# Altium footprint library agh_racing_2018.PcbLib: 166 footprints (part 7 of 11)
Each footprint in its own frame and in the unit in brackets; x right, y up, seen from the top. Pads: shape width x height; smd on the part's side, far side on the other; paste and mask are expansions set on the pad; w line width, h text height; cw(c..) or ccw(c..) is an arc to the next point about the centre after c.
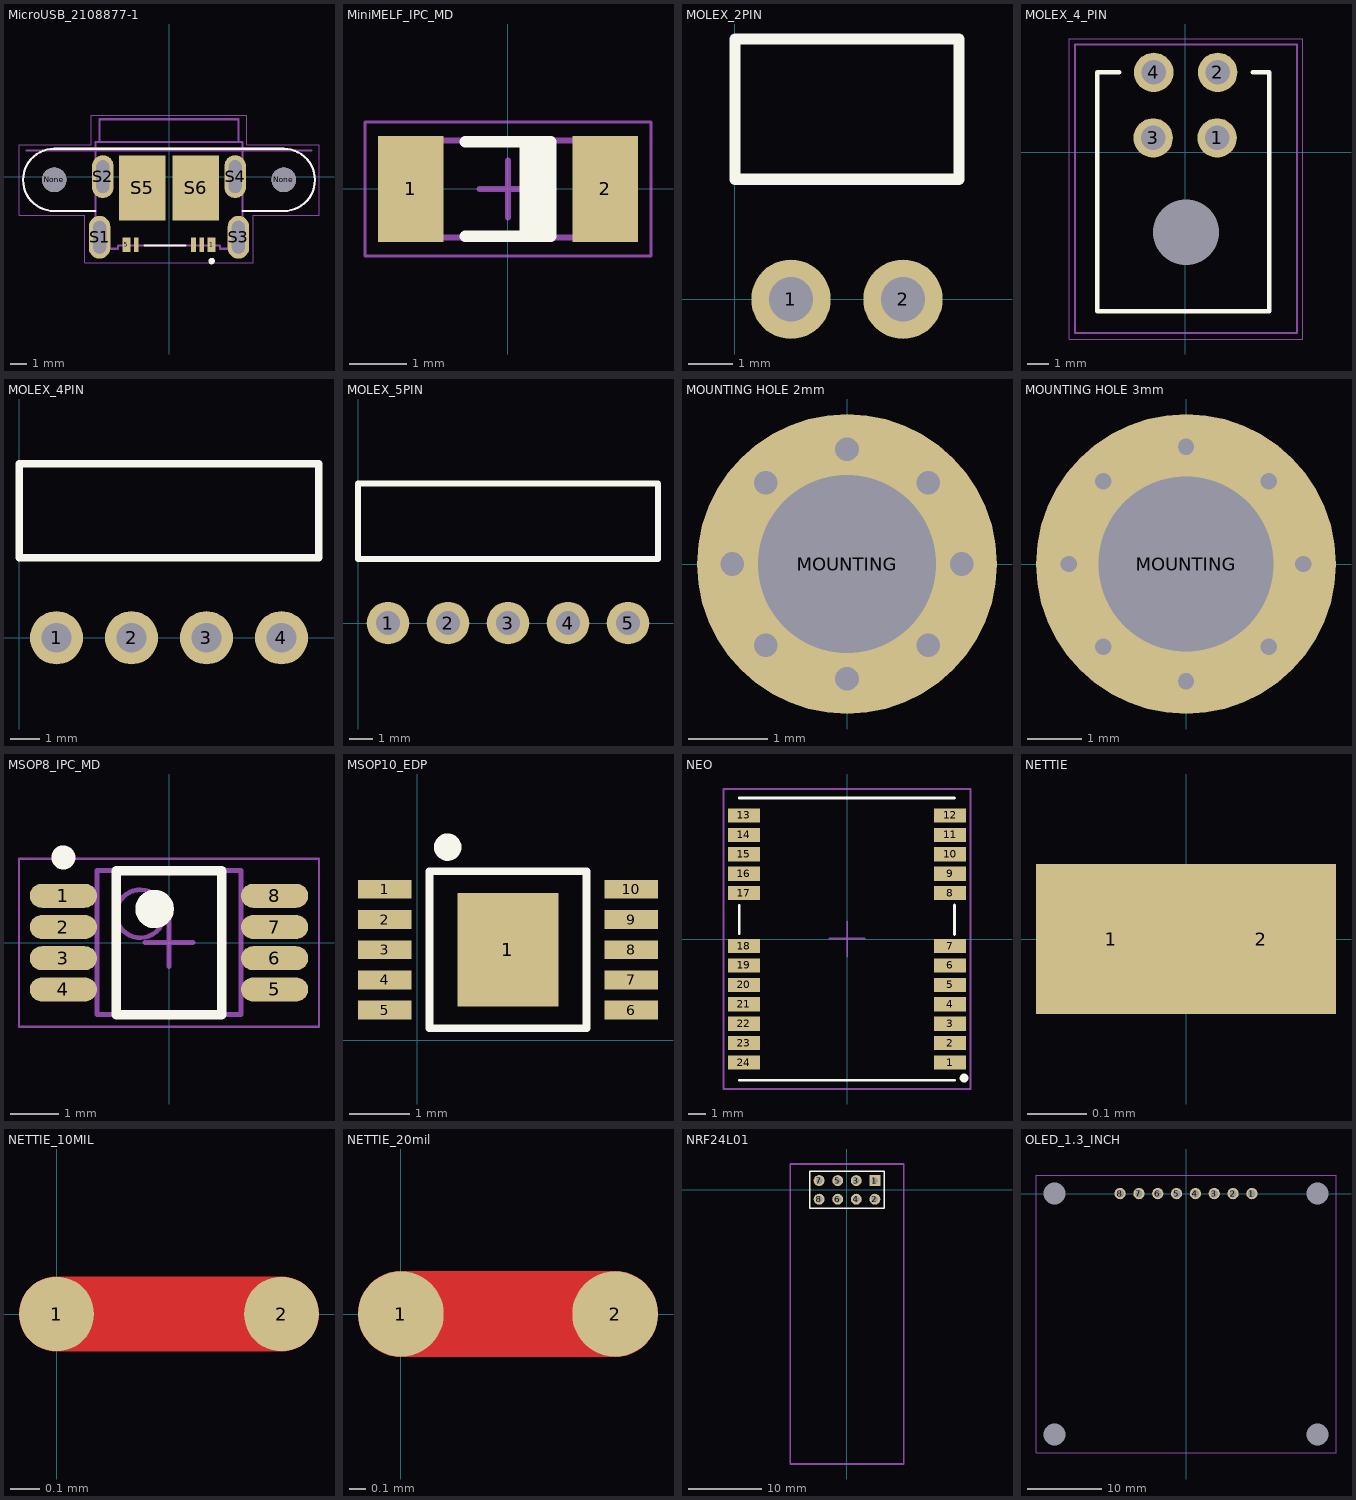
[diagram p6: the footprints below, top view; thin cyan lines are the x and y axes]

## MicroUSB_2108877-1 [mm]
pads (13):
  rect 0.5x0.9 smd: 1(2.6,-4.15) 5(-2.6,-4.15)
  rect 0.3x0.9 smd: 2(2,-4.15) 3(1.5,-4.15) 4(-2,-4.15)
  round 1.5 hole 1.5 unplated: None(-7,-0.2) None(7,-0.2)
  oval 1.308x2.616 hole 0.8 slot 2 at 90 deg: S1(-4.235,-3.7) S2(-4.035,0) S3(4.235,-3.7) S4(4.035,0)
  rect 2.85x3.98 smd: S5(-1.625,-0.69) S6(1.625,-0.69)
Top Overlay:
  circle w0.2: c2.6,-5.15 r0.1
  lines w0.127: -4.5,-2.1 -7,-2.1 cw(c-7,-0.2) -8.9,-0.2 cw(c-7,-0.2) -7,1.7 -4.485,1.7 4.485,1.7 7,1.7 cw(c7,-0.2) 8.9,-0.2 cw(c7,-0.2) 7,-2.1 4.5,-2.1 ; -1.5,-4.2 1,-4.2
Mechanical 1:
  lines w0: -4.635,-4.2 ccw(c-4.235,-4.2) -4.235,-4.6 ccw(c-4.235,-4.2) -3.835,-4.2 -3.835,-3.2 ccw(c-4.235,-3.2) -4.235,-2.8 ccw(c-4.235,-3.2) -4.635,-3.2 -4.635,-4.2 ; -4.435,-0.5 ccw(c-4.035,-0.5) -4.035,-0.9 ccw(c-4.035,-0.5) -3.635,-0.5 -3.635,0.5 ccw(c-4.035,0.5) -4.035,0.9 ccw(c-4.035,0.5) -4.435,0.5 -4.435,-0.5 ; 3.635,-0.5 ccw(c4.035,-0.5) 4.035,-0.9 ccw(c4.035,-0.5) 4.435,-0.5 4.435,0.5 ccw(c4.035,0.5) 4.035,0.9 ccw(c4.035,0.5) 3.635,0.5 3.635,-0.5 ; 3.835,-4.2 ccw(c4.235,-4.2) 4.235,-4.6 ccw(c4.235,-4.2) 4.635,-4.2 4.635,-3.2 ccw(c4.235,-3.2) 4.235,-2.8 ccw(c4.235,-3.2) 3.835,-3.2 3.835,-4.2
Courtyard Top:
  lines w0.127: -8.9,-0.2 cw(c-7,-0.2) -7,1.7 ; -8.9,-0.2 ccw(c-7,-0.2) -7,-2.1 ; -8.9,-0.2 cw(c-7,-0.2) -7,1.7 ; -8.9,-0.2 ccw(c-7,-0.2) -7,-2.1 ; -7,-2.1 -4.485,-2.1 ; -7,-2.1 -4.485,-2.1 ; -7,1.7 -4.485,1.7 ; -7,1.7 -4.485,1.7 ; -4.485,-4.4 -3.1,-4.4 ; -4.485,-4.4 -4.485,-2.1 ; -4.485,-4.4 -3.1,-4.4 ; -4.485,-4.4 -4.485,-2.1 ; -4.485,-2.1 -4.485,1.715 ; -4.485,-2.1 -4.485,1.715 ; -4.485,1.7 cw(c-4.477,1.707) -4.485,1.715 ; -4.485,1.7 cw(c-4.477,1.707) -4.485,1.715 ; -4.485,1.7 4.485,1.7 ; -4.485,1.7 4.485,1.7 ; -4.485,1.715 -4.485,2.1 ; -4.485,1.715 -4.485,2.1 ; -4.485,2.1 -4.235,2.1 ; -4.485,2.1 -4.235,2.1 ; -4.235,2.1 4.235,2.1 ; -4.235,2.1 -4.235,3.5 ; -4.235,2.1 4.235,2.1 ; -4.235,2.1 -4.235,3.5 ; -4.235,3.5 4.235,3.5 ; -4.235,3.5 4.235,3.5 ; -3.1,-4.4 -3.1,-4.2 ; -3.1,-4.4 -3.1,-4.2 ; -3.1,-4.2 3.1,-4.2 ; -3.1,-4.2 3.1,-4.2 ; 3.1,-4.4 3.1,-4.2 ; 3.1,-4.4 4.485,-4.4 ; 3.1,-4.4 3.1,-4.2 ; 3.1,-4.4 4.485,-4.4 ; 4.235,2.1 4.485,2.1 ; 4.235,2.1 4.235,3.5 ; 4.235,2.1 4.485,2.1 ; 4.235,2.1 4.235,3.5 ; 4.485,-4.4 4.485,-2.1 ; 4.485,-4.4 4.485,-2.1 ; 4.485,-2.1 4.485,1.715 ; 4.485,-2.1 7,-2.1 ; 4.485,-2.1 4.485,1.715 ; 4.485,-2.1 7,-2.1 ; 4.485,1.7 ccw(c4.477,1.707) 4.485,1.715 ; 4.485,1.7 ccw(c4.477,1.707) 4.485,1.715 ; 4.485,1.7 7,1.7 ; 4.485,1.7 7,1.7 ; 4.485,1.715 4.485,2.1 ; 4.485,1.715 4.485,2.1 ; 7,-2.1 ccw(c7,-0.2) 8.9,-0.2 ; 7,-2.1 ccw(c7,-0.2) 8.9,-0.2 ; 7,1.7 cw(c7,-0.2) 8.9,-0.2 ; 7,1.7 cw(c7,-0.2) 8.9,-0.2 ; -8.7,1.6 8.7,1.6 -8.7,1.6
Mechanical 16:
  lines w0.05: -9.15,-2.35 -9.15,1.95 -4.735,1.95 -4.735,3.75 4.735,3.75 4.735,1.95 9.15,1.95 9.15,-2.35 5.14,-2.35 5.14,-5.26 -5.14,-5.26 -5.14,-2.35 -9.15,-2.35
3D body "c-2108877-1-b-3d.stp": height 3.39, standoff -0.64, extent -8.9,-4.4 8.9,3.5

## MiniMELF_IPC_MD [mm] "MELF Diode, 2-Leads, Body 3.50x1.65mm, IPC Medium Density"
height 1.7
pads (2):
  rect 1.15x1.85 smd: 1(-1.7,0) 2(1.7,0)
Top Overlay:
  rectangle: 0.2,-0.825 0.75,0.825
  lines w0.2: -0.75,-0.825 0.75,-0.825 0.75,0.825 -0.75,0.825
Mechanical 13:
  lines w0.1: -1.85,-0.85 1.85,-0.85 1.85,0.85 -1.85,0.85 -1.85,-0.85
Mechanical 15:
  lines w0.05: -2.5,-1.175 2.5,-1.175 2.5,1.175 -2.5,1.175 -2.5,-1.175
  lines w0.1: -0.5,0 0.5,0 ; 0,-0.5 0,0.5
3D body "MiniMELF_IPC_MD2.step": height 1.65, standoff 0.01, extent -1.75,-0.823 1.75,0.823

## MOLEX_2PIN [mm] "MOLEX Connector, 2-pin"
pads (2):
  round 1.8 hole 1: 1(1.27,0) 2(3.81,0)
Top Overlay:
  lines w0.254: 0,2.72 0,5.9 5.08,5.9 5.08,2.72 0,2.72
3D body "022057028.stp": height 5.84, standoff -3.8, extent 0,-0.318 5.08,14.42

## MOLEX_4_PIN [mm]
height 7.75
pads (5):
  round 1.8 hole 1.12: 1(1.45,0.66) 2(1.475,3.66) 3(-1.475,0.66) 4(-1.45,3.66)
  round 0 hole 3: ""(0.025,-3.66)
Top Overlay:
  lines w0.2: -3.023,3.66 -4.039,3.66 -4.039,-7.262 3.835,-7.262 3.835,3.66 3.073,3.66
Mechanical 1:
  lines w0.1: -5.05,-8.26 5.1,-8.26 5.1,4.93 -5.05,4.93 -5.05,-8.26
Mechanical 15:
  lines w0.05: -5.309,-8.532 -5.309,5.184 5.359,5.184 5.359,-8.532 -5.309,-8.532
3D body "430450400.stp": height 8.77, standoff -3.17, extent -5.05,-8.26 5.1,3.98

## MOLEX_4PIN [mm] "MOLEX Connector, 4-pin"
pads (4):
  round 1.8 hole 1: 1(1.27,0) 2(3.81,0) 3(6.35,0) 4(8.89,0)
Top Overlay:
  lines w0.254: 0,2.72 10.16,2.72 10.16,5.9 0,5.9 0,2.72
3D body "022057048.stp": height 5.85, standoff -3.79, extent 0,-0.317 10.16,14.42

## MOLEX_5PIN [mm] "MOLEX Connector, 5-pin"
pads (5):
  round 1.8 hole 1: 1(1.27,0) 2(3.81,0) 3(6.35,0) 4(8.89,0) 5(11.43,0)
Top Overlay:
  lines w0.254: 0,2.72 12.7,2.72 12.7,5.9 0,5.9 0,2.72
3D body "022057058.stp": height 5.85, standoff -3.79, extent 0,-0.317 12.7,14.42

## MOUNTING HOLE 2mm [mm]
pads (1):
  round 3.8 hole 2.25 paste+0 mask+0: MOUNTING(0,0)
via -1.455,0 diameter 0.711 hole 0.3
via -1.029,-1.029 diameter 0.711 hole 0.3
via 0,-1.455 diameter 0.711 hole 0.3
via 1.029,-1.029 diameter 0.711 hole 0.3
via 1.455,0 diameter 0.711 hole 0.3
via 1.029,1.029 diameter 0.711 hole 0.3
via 0,1.455 diameter 0.711 hole 0.3
via -1.029,1.029 diameter 0.711 hole 0.3

## MOUNTING HOLE 3mm [mm]
pads (1):
  round 5.5 hole 3.2 paste+0 mask+0: MOUNTING(0,0)
via -2.15,0 diameter 0.711 hole 0.3
via -1.52,1.52 diameter 0.711 hole 0.3
via 1.52,1.52 diameter 0.711 hole 0.3
via 2.15,0 diameter 0.711 hole 0.3
via 1.52,-1.52 diameter 0.711 hole 0.3
via 0,-2.15 diameter 0.711 hole 0.3
via -1.52,-1.52 diameter 0.711 hole 0.3
via 0,2.15 diameter 0.711 hole 0.3

## MSOP8_IPC_MD [mm] "TSOP, 8-Leads, Body 3.00x3.00mm, Pitch 0.65mm, IPC Medium Density"
height 1.1
pads (8):
  oval 1.4x0.5 smd: 1(-2.2,0.975) 2(-2.2,0.325) 3(-2.2,-0.325) 4(-2.2,-0.975) 5(2.2,-0.975) 6(2.2,-0.325) 7(2.2,0.325) 8(2.2,0.975)
Top Overlay:
  circle w0.25: c-2.2,1.775 r0.125
  circle w0.4: c-0.3,0.7 r0.2
  lines w0.2: -1.1,-1.5 -1.1,1.5 1.1,1.5 1.1,-1.5 -1.1,-1.5
Mechanical 13:
  circle w0.1: c-0.6,0.6 r0.5
  lines w0.1: -1.5,-1.5 -1.5,1.5 1.5,1.5 1.5,-1.5 -1.5,-1.5
Mechanical 15:
  lines w0.05: -3.125,-1.75 -3.125,1.75 3.125,1.75 3.125,-1.75 -3.125,-1.75
  lines w0.1: -0.5,0 0.5,0 ; 0,-0.5 0,0.5
3D body "MSOP8_IPC_MD.step": height 1.1, standoff 0, extent -2.45,-1.5 2.45,1.5

## MSOP10_EDP [mm] "MSOP, 10-pin, Exposed Die Pad"
pads (11):
  rect 0.89x0.31 smd: 1(-0.54,2.5) 2(-0.54,2) 3(-0.54,1.5) 4(-0.54,1) 5(-0.54,0.5) 6(3.54,0.5) 7(3.54,1) 8(3.54,1.5) 9(3.54,2) 10(3.54,2.5)
  rect 1.68x1.88 smd: 1(1.5,1.5)
Top Overlay:
  circle w0.254: c0.5,3.2 r0.1
  lines w0.127: 0.2,0.2 2.8,0.2 2.8,2.8 0.2,2.8 0.2,0.2
3D body "msop-10.SLDPRT": height 1.16, standoff 0.01, extent -0.95,0 3.95,3

## NEO [mm] "u-blox NEO GNSS module"
pads (24):
  rect 1.8x0.8 smd paste-0.1: 1(5.842,-7) 2(5.842,-5.9) 3(5.842,-4.8) 4(5.842,-3.7) 5(5.842,-2.6) 6(5.842,-1.5) 7(5.842,-0.4) 8(5.842,2.6) 9(5.842,3.7) 10(5.842,4.8) 11(5.842,5.9) 12(5.842,7) 13(-5.842,7) 14(-5.842,5.9) 15(-5.842,4.8) 16(-5.842,3.7) 17(-5.842,2.6) 18(-5.842,-0.4) 19(-5.842,-1.5) 20(-5.842,-2.6) 21(-5.842,-3.7) 22(-5.842,-4.8) 23(-5.842,-5.9) 24(-5.842,-7)
Top Overlay:
  circle w0.38: c6.636,-7.879 r0.058
  lines w0.16: -6.109,-8 6.096,-8 ; -6.109,7.996 6.09,7.996 ; -6.102,0.299 -6.102,1.893 ; 6.096,0.255 6.096,1.919
Top Paste:
  rectangle: 5.642,-7.4 6.842,-6.6
  rectangle: 5.642,-6.3 6.842,-5.5
  rectangle: 5.642,-5.2 6.842,-4.4
  rectangle: 5.642,-4.1 6.842,-3.3
  rectangle: 5.642,-3 6.842,-2.2
  rectangle: 5.642,-1.9 6.842,-1.1
  rectangle: 5.642,-0.8 6.842,0
  rectangle: 5.642,2.2 6.842,3
  rectangle: 5.642,3.3 6.842,4.1
  rectangle: 5.642,4.4 6.842,5.2
  rectangle: 5.642,5.5 6.842,6.3
  rectangle: 5.642,6.6 6.842,7.4
  rectangle: -6.833,6.6 -5.633,7.4
  rectangle: -6.833,5.5 -5.633,6.3
  rectangle: -6.833,4.4 -5.633,5.2
  rectangle: -6.833,3.3 -5.633,4.1
  rectangle: -6.833,2.2 -5.633,3
  rectangle: -6.833,-0.8 -5.633,0
  rectangle: -6.833,-1.9 -5.633,-1.1
  rectangle: -6.833,-3 -5.633,-2.2
  rectangle: -6.833,-5.2 -5.633,-4.4
  rectangle: -6.833,-6.3 -5.633,-5.5
  rectangle: -6.833,-7.4 -5.633,-6.6
  rectangle: -6.833,-4.1 -5.633,-3.3
Mechanical 13:
  text ".Designator" at -5.585,9.867 h1
Mechanical 15:
  lines w0.1: -1,0.024 0.02,0.024 ; 0.02,-1 0.02,0.024 ; 0.02,1 0.02,0.024 ; 1,0.024 0.02,0.024 ; -7,-8.5 7,-8.5 7,8.5 -7,8.5 -7,-8.5
3D body "NEO (STEP-AP214)_B.STEP": height 2.28, standoff -0.05, extent -6.104,-8 6.096,8

## NETTIE [mil]
pads (2):
  rect 10x10 smd paste+0 mask+0: 1(-5,0) 2(5,0)

## NETTIE_10MIL [mil]
pads (2):
  round 10 smd paste+0 mask+0: 1(0,0) 2(30,0)
Top Layer:
  lines w10: 0,0 30,0

## NETTIE_20mil [mil]
pads (2):
  round 20 smd paste+0 mask+0: 1(0,0) 2(50,0)
Top Layer:
  lines w20: 0,0 50,0

## NRF24L01 [mm]
pads (8):
  rect 1.5x1.5 hole 0.9: 1(3.81,1.27)
  round 1.5 hole 0.9: 2(3.81,-1.27) 3(1.27,1.27) 4(1.27,-1.27) 5(-1.27,1.27) 6(-1.27,-1.27) 7(-3.81,1.27) 8(-3.81,-1.27)
Top Overlay:
  lines w0.2: -5.08,0 -5.08,2.54 5.08,2.54 5.08,0 ; -5.08,0.54 -5.08,-2.54 5.08,-2.54 5.08,0.54
Mechanical 1:
  lines w0.254: -7.75,-37.46 7.75,-37.46 7.75,3.54 -7.75,3.54 -7.75,-37.46
3D body "EL-02001-AA NRF42L01.STEP": height 16.39, standoff -4.6, extent -7.75,-146.656 7.75,3.54

## OLED_1.3_INCH [mm]
pads (12):
  round 1.524 hole 1: 1(8.89,0) 2(6.35,0) 3(3.81,0) 4(1.27,0) 5(-1.27,0) 6(-3.81,0) 7(-6.35,0) 8(-8.89,0)
  round 0 hole 3: ""(-17.75,-32.5) ""(-17.75,0) ""(17.75,-32.5) ""(17.75,0)
Mechanical 1:
  lines w0.1: -20.25,-35 20.25,-35 20.25,2.5 -20.25,2.5 -20.25,-35
3D body: height 12.5, standoff 7.5, extent -20.25,-35 20.25,2.5